# Altium footprint library Library.PcbLib: 308 footprints (part 4 of 21)
Each footprint in its own frame and in the unit in brackets; x right, y up, seen from the top. Pads: shape width x height; smd on the part's side, far side on the other; paste and mask are expansions set on the pad; w line width, h text height; cw(c..) or ccw(c..) is an arc to the next point about the centre after c.
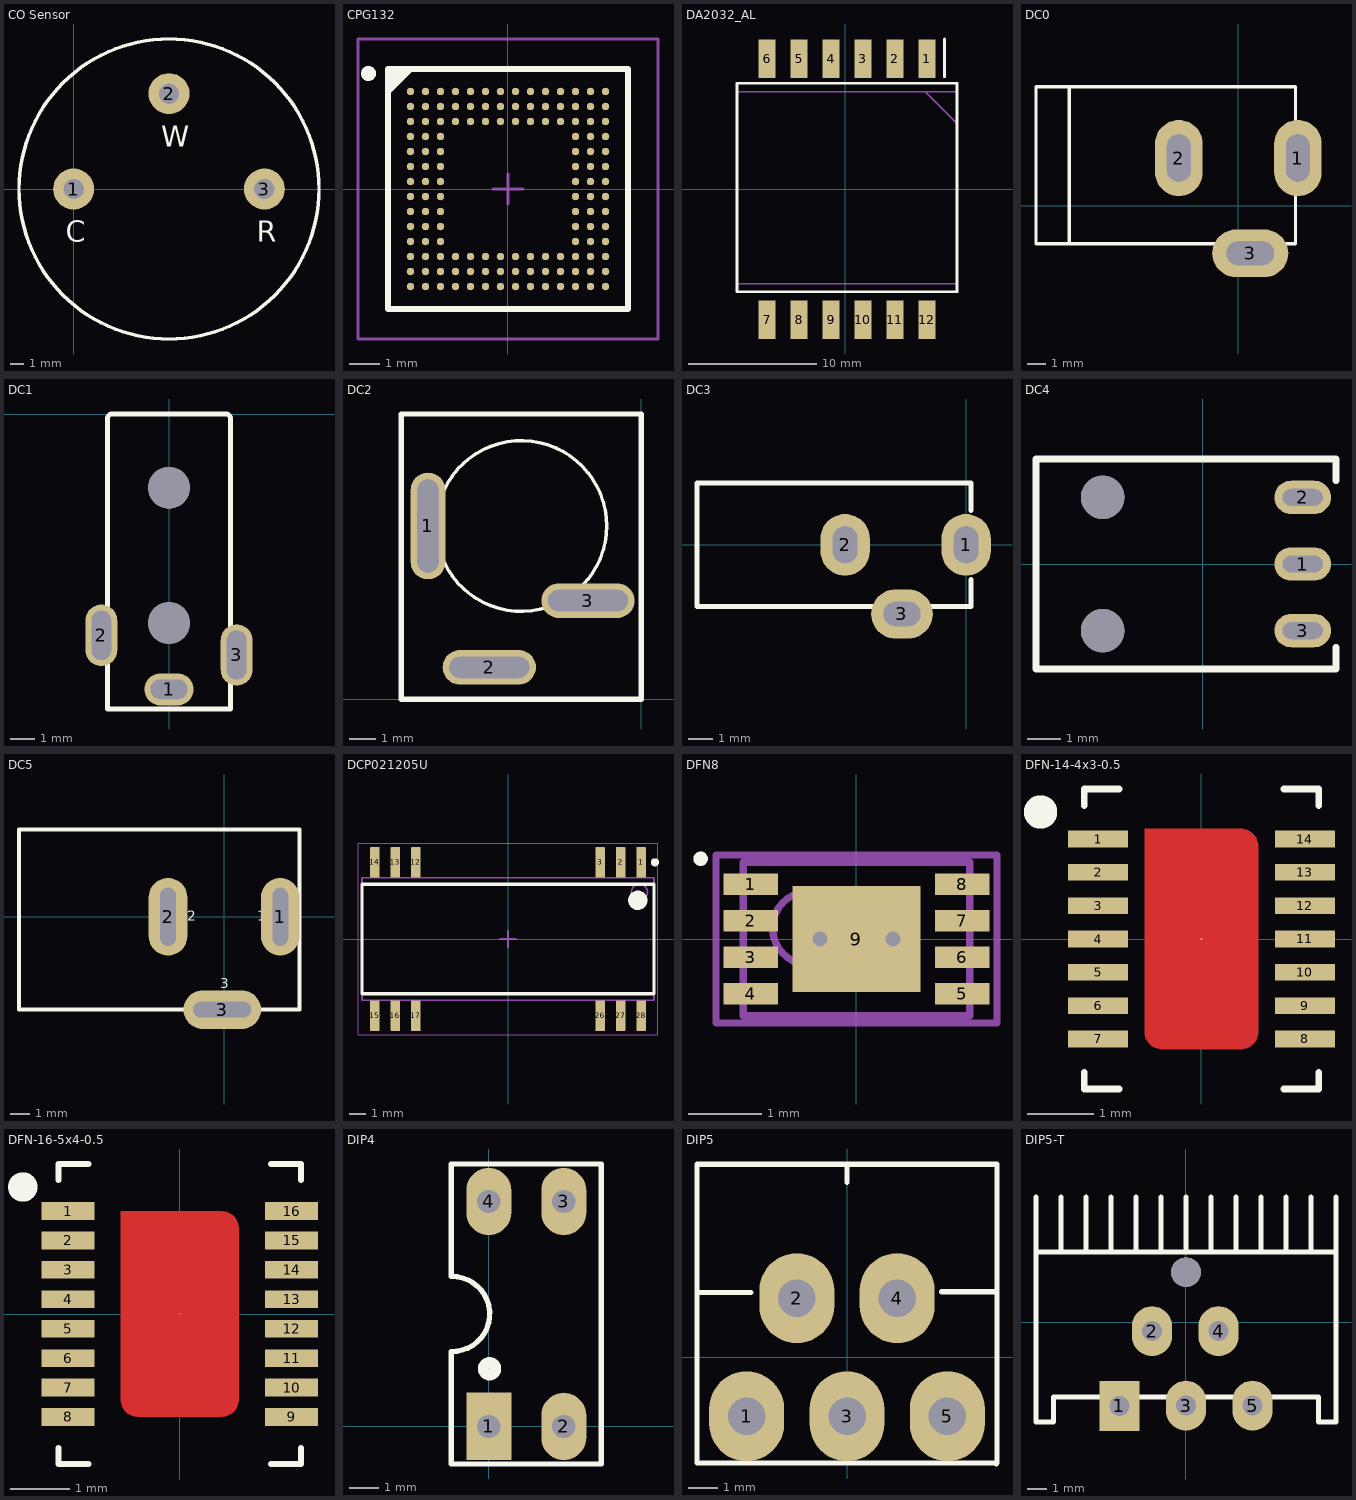
[diagram p3: the footprints below, top view; thin cyan lines are the x and y axes]

## CO Sensor [mm]
pads (3):
  round 3 hole 1.5: 1(0,0) 2(7,7) 3(14,0)
Top Overlay:
  circle w0.254: c7,0 r11
  text "C" at -0.559,-3.886 h1.52
  text "W" at 6.441,3.114 h1.52
  text "R" at 13.441,-3.886 h1.52

## CPG132 [mm] "BGA, 132-Leads, Body 8x8mm, Pitch 0.5mm"
height 1.1
pads (132):
  round 0.25 smd: A1(-3.25,3.25) A2(-2.75,3.25) A3(-2.25,3.25) A4(-1.75,3.25) A5(-1.25,3.25) A6(-0.75,3.25) A7(-0.25,3.25) A8(0.25,3.25) A9(0.75,3.25) A10(1.25,3.25) A11(1.75,3.25) A12(2.25,3.25) A13(2.75,3.25) A14(3.25,3.25) B1(-3.25,2.75) B2(-2.75,2.75) B3(-2.25,2.75) B4(-1.75,2.75) B5(-1.25,2.75) B6(-0.75,2.75) B7(-0.25,2.75) B8(0.25,2.75) B9(0.75,2.75) B10(1.25,2.75) B11(1.75,2.75) B12(2.25,2.75) B13(2.75,2.75) B14(3.25,2.75) C1(-3.25,2.25) C2(-2.75,2.25) C3(-2.25,2.25) C4(-1.75,2.25) C5(-1.25,2.25) C6(-0.75,2.25) C7(-0.25,2.25) C8(0.25,2.25) C9(0.75,2.25) C10(1.25,2.25) C11(1.75,2.25) C12(2.25,2.25) C13(2.75,2.25) C14(3.25,2.25) D1(-3.25,1.75) D2(-2.75,1.75) D3(-2.25,1.75) D12(2.25,1.75) D13(2.75,1.75) D14(3.25,1.75) E1(-3.25,1.25) E2(-2.75,1.25) E3(-2.25,1.25) E12(2.25,1.25) E13(2.75,1.25) E14(3.25,1.25) F1(-3.25,0.75) F2(-2.75,0.75) F3(-2.25,0.75) F12(2.25,0.75) F13(2.75,0.75) F14(3.25,0.75) G1(-3.25,0.25) G2(-2.75,0.25) G3(-2.25,0.25) G12(2.25,0.25) G13(2.75,0.25) G14(3.25,0.25) H1(-3.25,-0.25) H2(-2.75,-0.25) H3(-2.25,-0.25) H12(2.25,-0.25) H13(2.75,-0.25) H14(3.25,-0.25) J1(-3.25,-0.75) J2(-2.75,-0.75) J3(-2.25,-0.75) J12(2.25,-0.75) J13(2.75,-0.75) J14(3.25,-0.75) K1(-3.25,-1.25) K2(-2.75,-1.25) K3(-2.25,-1.25) K12(2.25,-1.25) K13(2.75,-1.25) K14(3.25,-1.25) L1(-3.25,-1.75) L2(-2.75,-1.75) L3(-2.25,-1.75) L12(2.25,-1.75) L13(2.75,-1.75) L14(3.25,-1.75) M1(-3.25,-2.25) M2(-2.75,-2.25) M3(-2.25,-2.25) M4(-1.75,-2.25) M5(-1.25,-2.25) M6(-0.75,-2.25) M7(-0.25,-2.25) M8(0.25,-2.25) M9(0.75,-2.25) M10(1.25,-2.25) M11(1.75,-2.25) M12(2.25,-2.25) M13(2.75,-2.25) M14(3.25,-2.25) N1(-3.25,-2.75) N2(-2.75,-2.75) N3(-2.25,-2.75) N4(-1.75,-2.75) N5(-1.25,-2.75) N6(-0.75,-2.75) N7(-0.25,-2.75) N8(0.25,-2.75) N9(0.75,-2.75) N10(1.25,-2.75) N11(1.75,-2.75) N12(2.25,-2.75) N13(2.75,-2.75) N14(3.25,-2.75) P1(-3.25,-3.25) P2(-2.75,-3.25) P3(-2.25,-3.25) P4(-1.75,-3.25) P5(-1.25,-3.25) P6(-0.75,-3.25) P7(-0.25,-3.25) P8(0.25,-3.25) P9(0.75,-3.25) P10(1.25,-3.25) P11(1.75,-3.25) P12(2.25,-3.25) P13(2.75,-3.25) P14(3.25,-3.25)
Top Overlay:
  circle w0.25: c-4.65,3.85 r0.125
  region: -3.242,4 -4,3.242 -4,4
  lines w0.2: -4,3.242 -3.242,4 ; -4,-4 -4,4 4,4 4,-4 -4,-4
Mechanical 13:
  lines w0.1: -4,-4 -4,4 4,4 4,-4 -4,-4
Mechanical 15:
  lines w0.1: -0.5,0 0.5,0 ; 0,-0.5 0,0.5 ; -5,-5 -5,5 5,5 5,-5 -5,-5
3D body: height 0.23, standoff -0.03, extent 1.119,3.126 1.372,3.378
3D body: height 0.23, standoff -0.03, extent 1.119,2.618 1.372,2.87
3D body: height 0.23, standoff -0.03, extent 1.119,2.135 1.372,2.388
3D body: height 0.23, standoff -0.03, extent 1.627,2.135 1.88,2.388
3D body: height 0.23, standoff -0.03, extent 1.627,2.618 1.88,2.87
3D body: height 0.23, standoff -0.03, extent 1.627,3.126 1.88,3.378
3D body: height 0.23, standoff -0.03, extent 0.636,2.135 0.889,2.388
3D body: height 0.23, standoff -0.03, extent 0.636,2.618 0.889,2.87
3D body: height 0.23, standoff -0.03, extent 0.636,3.126 0.889,3.378
3D body: height 0.23, standoff -0.03, extent 0.128,2.135 0.381,2.388
3D body: height 0.23, standoff -0.03, extent 0.128,2.618 0.381,2.87
3D body: height 0.23, standoff -0.03, extent 0.128,3.126 0.381,3.378
3D body: height 0.23, standoff -0.03, extent -0.38,2.135 -0.127,2.388
3D body: height 0.23, standoff -0.03, extent -0.38,2.618 -0.127,2.87
3D body: height 0.23, standoff -0.03, extent -0.38,3.126 -0.127,3.378
3D body: height 0.23, standoff -0.03, extent -0.888,2.135 -0.635,2.388
3D body: height 0.23, standoff -0.03, extent -0.888,2.618 -0.635,2.87
3D body: height 0.23, standoff -0.03, extent -0.888,3.126 -0.635,3.378
3D body: height 0.23, standoff -0.03, extent -1.371,2.135 -1.118,2.388
3D body: height 0.23, standoff -0.03, extent -1.371,2.618 -1.118,2.87
3D body: height 0.23, standoff -0.03, extent -1.371,3.126 -1.118,3.378
3D body: height 0.23, standoff -0.03, extent -1.879,2.135 -1.626,2.388
3D body: height 0.23, standoff -0.03, extent -1.879,2.618 -1.626,2.87
3D body: height 0.23, standoff -0.03, extent -1.879,3.126 -1.626,3.378
3D body: height 0.23, standoff -0.03, extent -2.387,2.135 -2.134,2.388
3D body: height 0.23, standoff -0.03, extent -2.387,2.618 -2.134,2.87
3D body: height 0.23, standoff -0.03, extent -2.387,3.126 -2.134,3.378
3D body: height 0.23, standoff -0.03, extent -2.869,2.135 -2.616,2.388
3D body: height 0.23, standoff -0.03, extent -2.869,2.618 -2.616,2.87
3D body: height 0.23, standoff -0.03, extent -2.869,3.126 -2.616,3.378
3D body: height 0.23, standoff -0.03, extent -3.377,2.135 -3.124,2.388
3D body: height 0.23, standoff -0.03, extent -3.377,2.618 -3.124,2.87
3D body: height 0.23, standoff -0.03, extent -3.377,3.126 -3.124,3.378
3D body: height 0.23, standoff -0.03, extent 3.126,-1.372 3.378,-1.119
3D body: height 0.23, standoff -0.03, extent 2.618,-1.372 2.87,-1.119
3D body: height 0.23, standoff -0.03, extent 2.135,-1.372 2.388,-1.119
3D body: height 0.23, standoff -0.03, extent 2.135,-1.88 2.388,-1.627
3D body: height 0.23, standoff -0.03, extent 2.618,-1.88 2.87,-1.627
3D body: height 0.23, standoff -0.03, extent 3.126,-1.88 3.378,-1.627
3D body: height 0.23, standoff -0.03, extent 2.135,-0.889 2.388,-0.636
3D body: height 0.23, standoff -0.03, extent 2.618,-0.889 2.87,-0.636
3D body: height 0.23, standoff -0.03, extent 3.126,-0.889 3.378,-0.636
3D body: height 0.23, standoff -0.03, extent 2.135,-0.381 2.388,-0.128
3D body: height 0.23, standoff -0.03, extent 2.618,-0.381 2.87,-0.128
3D body: height 0.23, standoff -0.03, extent 3.126,-0.381 3.378,-0.128
3D body: height 0.23, standoff -0.03, extent 2.135,0.127 2.388,0.38
3D body: height 0.23, standoff -0.03, extent 2.618,0.127 2.87,0.38
3D body: height 0.23, standoff -0.03, extent 3.126,0.127 3.378,0.38
3D body: height 0.23, standoff -0.03, extent 2.135,0.635 2.388,0.888
3D body: height 0.23, standoff -0.03, extent 2.618,0.635 2.87,0.888
3D body: height 0.23, standoff -0.03, extent 3.126,0.635 3.378,0.888
3D body: height 0.23, standoff -0.03, extent 2.135,1.118 2.388,1.371
3D body: height 0.23, standoff -0.03, extent 2.618,1.118 2.87,1.371
3D body: height 0.23, standoff -0.03, extent 3.126,1.118 3.378,1.371
3D body: height 0.23, standoff -0.03, extent 2.135,1.626 2.388,1.879
3D body: height 0.23, standoff -0.03, extent 2.618,1.626 2.87,1.879
3D body: height 0.23, standoff -0.03, extent 3.126,1.626 3.378,1.879
3D body: height 0.23, standoff -0.03, extent 2.135,2.134 2.388,2.387
3D body: height 0.23, standoff -0.03, extent 2.618,2.134 2.87,2.387
3D body: height 0.23, standoff -0.03, extent 3.126,2.134 3.378,2.387
3D body: height 0.23, standoff -0.03, extent 2.135,2.616 2.388,2.869
3D body: height 0.23, standoff -0.03, extent 2.618,2.616 2.87,2.869
3D body: height 0.23, standoff -0.03, extent 3.126,2.616 3.378,2.869
3D body: height 0.23, standoff -0.03, extent 2.135,3.124 2.388,3.377
3D body: height 0.23, standoff -0.03, extent 2.618,3.124 2.87,3.377
3D body: height 0.23, standoff -0.03, extent 3.126,3.124 3.378,3.377
3D body: height 0.23, standoff -0.03, extent -1.372,-3.378 -1.119,-3.126
3D body: height 0.23, standoff -0.03, extent -1.372,-2.87 -1.119,-2.618
3D body: height 0.23, standoff -0.03, extent -1.372,-2.388 -1.119,-2.135
3D body: height 0.23, standoff -0.03, extent -1.88,-2.388 -1.627,-2.135
3D body: height 0.23, standoff -0.03, extent -1.88,-2.87 -1.627,-2.618
3D body: height 0.23, standoff -0.03, extent -1.88,-3.378 -1.627,-3.126
3D body: height 0.23, standoff -0.03, extent -0.889,-2.388 -0.636,-2.135
3D body: height 0.23, standoff -0.03, extent -0.889,-2.87 -0.636,-2.618
3D body: height 0.23, standoff -0.03, extent -0.889,-3.378 -0.636,-3.126
3D body: height 0.23, standoff -0.03, extent -0.381,-2.388 -0.128,-2.135
3D body: height 0.23, standoff -0.03, extent -0.381,-2.87 -0.128,-2.618
3D body: height 0.23, standoff -0.03, extent -0.381,-3.378 -0.128,-3.126
3D body: height 0.23, standoff -0.03, extent 0.127,-2.388 0.38,-2.135
3D body: height 0.23, standoff -0.03, extent 0.127,-2.87 0.38,-2.618
3D body: height 0.23, standoff -0.03, extent 0.127,-3.378 0.38,-3.126
3D body: height 0.23, standoff -0.03, extent 0.635,-2.388 0.888,-2.135
3D body: height 0.23, standoff -0.03, extent 0.635,-2.87 0.888,-2.618
3D body: height 0.23, standoff -0.03, extent 0.635,-3.378 0.888,-3.126
3D body: height 0.23, standoff -0.03, extent 1.118,-2.388 1.371,-2.135
3D body: height 0.23, standoff -0.03, extent 1.118,-2.87 1.371,-2.618
3D body: height 0.23, standoff -0.03, extent 1.118,-3.378 1.371,-3.126
3D body: height 0.23, standoff -0.03, extent 1.626,-2.388 1.879,-2.135
3D body: height 0.23, standoff -0.03, extent 1.626,-2.87 1.879,-2.618
3D body: height 0.23, standoff -0.03, extent 1.626,-3.378 1.879,-3.126
3D body: height 0.23, standoff -0.03, extent 2.134,-2.388 2.387,-2.135
3D body: height 0.23, standoff -0.03, extent 2.134,-2.87 2.387,-2.618
3D body: height 0.23, standoff -0.03, extent 2.134,-3.378 2.387,-3.126
3D body: height 0.23, standoff -0.03, extent 2.616,-2.388 2.869,-2.135
3D body: height 0.23, standoff -0.03, extent 2.616,-2.87 2.869,-2.618
3D body: height 0.23, standoff -0.03, extent 2.616,-3.378 2.869,-3.126
3D body: height 0.23, standoff -0.03, extent 3.124,-2.388 3.377,-2.135
3D body: height 0.23, standoff -0.03, extent 3.124,-2.87 3.377,-2.618
3D body: height 0.23, standoff -0.03, extent 3.124,-3.378 3.377,-3.126
3D body: height 0.23, standoff -0.03, extent -3.378,-3.377 -3.126,-3.124
3D body: height 0.23, standoff -0.03, extent -2.87,-3.377 -2.618,-3.124
3D body: height 0.23, standoff -0.03, extent -2.388,-3.377 -2.135,-3.124
3D body: height 0.23, standoff -0.03, extent -3.378,-2.869 -3.126,-2.616
3D body: height 0.23, standoff -0.03, extent -2.87,-2.869 -2.618,-2.616
3D body: height 0.23, standoff -0.03, extent -2.388,-2.869 -2.135,-2.616
3D body: height 0.23, standoff -0.03, extent -3.378,-2.387 -3.126,-2.134
3D body: height 0.23, standoff -0.03, extent -2.87,-2.387 -2.618,-2.134
3D body: height 0.23, standoff -0.03, extent -2.388,-2.387 -2.135,-2.134
3D body: height 0.23, standoff -0.03, extent -3.378,-1.879 -3.126,-1.626
3D body: height 0.23, standoff -0.03, extent -2.87,-1.879 -2.618,-1.626
3D body: height 0.23, standoff -0.03, extent -2.388,-1.879 -2.135,-1.626
3D body: height 0.23, standoff -0.03, extent -3.378,-1.371 -3.126,-1.118
3D body: height 0.23, standoff -0.03, extent -2.87,-1.371 -2.618,-1.118
3D body: height 0.23, standoff -0.03, extent -2.388,-1.371 -2.135,-1.118
3D body: height 0.23, standoff -0.03, extent -3.378,-0.888 -3.126,-0.635
3D body: height 0.23, standoff -0.03, extent -2.87,-0.888 -2.618,-0.635
3D body: height 0.23, standoff -0.03, extent -2.388,-0.888 -2.135,-0.635
3D body: height 0.23, standoff -0.03, extent -3.378,-0.38 -3.126,-0.127
3D body: height 0.23, standoff -0.03, extent -2.87,-0.38 -2.618,-0.127
3D body: height 0.23, standoff -0.03, extent -2.388,-0.38 -2.135,-0.127
3D body: height 0.23, standoff -0.03, extent -3.378,0.128 -3.126,0.381
3D body: height 0.23, standoff -0.03, extent -2.87,0.128 -2.618,0.381
3D body: height 0.23, standoff -0.03, extent -2.388,0.128 -2.135,0.381
3D body: height 0.23, standoff -0.03, extent -3.378,0.636 -3.126,0.889
3D body: height 0.23, standoff -0.03, extent -2.87,0.636 -2.618,0.889
3D body: height 0.23, standoff -0.03, extent -2.388,0.636 -2.135,0.889
3D body: height 0.23, standoff -0.03, extent -3.378,1.627 -3.126,1.88
3D body: height 0.23, standoff -0.03, extent -2.87,1.627 -2.618,1.88
3D body: height 0.23, standoff -0.03, extent -2.388,1.627 -2.135,1.88
3D body: height 0.23, standoff -0.03, extent -2.388,1.119 -2.135,1.372
3D body: height 0.23, standoff -0.03, extent -2.87,1.119 -2.618,1.372
3D body: height 0.23, standoff -0.03, extent -3.378,1.119 -3.126,1.372
3D body: height 1.07, standoff 0.25, extent -3.556,-3.556 3.556,3.556
3D body: height 0.48, standoff 0.46, extent -4,3.111 -3.111,4
3D body: height 0.46, standoff 0.2, extent -4,-4 4,4

## DA2032_AL [mm]
pads (12):
  rect 1.3x3 smd: 1(6.377,10.2) 2(3.877,10.2) 3(1.377,10.2) 4(-1.123,10.2) 5(-3.623,10.2) 6(-6.123,10.2) 7(-6.123,-10.2) 8(-3.623,-10.2) 9(-1.123,-10.2) 10(1.377,-10.2) 11(3.877,-10.2) 12(6.377,-10.2)
Top Overlay:
  lines w0.2: 7.75,8.8 7.75,11.75 ; -8.473,-8.023 8.727,-8.023 8.727,8.277 -8.473,8.277 -8.473,-8.023
Top Courtyard:
  lines w0.1: 6.227,7.617 8.727,5.117 ; -8.473,-7.363 8.727,-7.363 8.727,7.617 -8.473,7.617 -8.473,-7.363
3D body "DA2032_AL.STEP": height 8.94, standoff 0, extent -8.473,-11 8.727,11

## DC0 [mil] "Jac DC input"
height 200
pads (3):
  oval 100x160 hole 50 slot 100 at 90 deg: 1(125,100) 2(-125,100)
  oval 160x100 hole 50 slot 100 at 0 deg: 3(25,-100)
Top Overlay:
  lines w7: -355,-80 -355,250 ; -425,-80 -425,250 120,250 120,-80 -425,-80
3D body "SW3dPS-dc range - dc connector[4840.2201].STEP": height 433.67, standoff -137.2, extent -410.35,-105.12 134,269.12

## DC1 [mm] "WR-DC_DC Power Jack_Right Angled_THT Center Pin ?0.65_Plug ID ?0.75_Plug OD ?2.35_with Peg"
height 5
pads (5):
  oval 2x1.3 hole 0.8 slot 1.5 at 0 deg: 1(0,-11.2)
  oval 1.3x2.5 hole 0.8 slot 2 at 90 deg: 2(-2.75,-9) 3(2.75,-9.8)
  round 1.7 hole 1.7 unplated: ""(0,-8.5) ""(0,-3)
Top Overlay:
  lines w0.2: -2.5,-12 2.5,-12 2.5,-0.2 ccw(c2.312,-0.188) 2.3,0 -2.3,0 ccw(c-2.312,-0.188) -2.5,-0.2 -2.5,-12
3D body "694101308002.stp": height 5, standoff -2.3, extent -2.9,-12 2.9,0

## DC2 [mm] "WR-DC_DC Power Jack_Vertical_THT WR-DC_DC Power Jack_Vertical_THT"
height 14
pads (3):
  oval 1.3x4 hole 0.8 slot 3.5 at 90 deg: 1(-8,6.5)
  oval 3.5x1.3 hole 0.8 slot 3 at 0 deg: 2(-5.7,1.2) 3(-2,3.7)
Top Overlay:
  circle w0.127: c-4.5,6.5 r3.2
  lines w0.2: -9,0 0,0 0,10.7 -9,10.7 -9,0
3D body "694106402002.stp": height 14, standoff -3.6, extent -9,0 0,10.7

## DC3 [mm] "WR-DC_DC Power Jack_Right Angled_THT Center Pin ?1.0_Plug ID ?1.05_Plug OD ?3.5"
height 7.4
pads (3):
  oval 2x2.5 hole 1 slot 1.5 at 90 deg: 1(0,0) 2(-4.9,0)
  oval 2.5x2 hole 1 slot 1.5 at 0 deg: 3(-2.6,-2.8)
Top Overlay:
  lines w0.2: -3.8,-2.5 -10.9,-2.5 -10.9,2.5 0.2,2.5 0.2,1.4 ; -1.4,-2.5 0.2,-2.5 0.2,-1.4
3D body "694102303002.stp": height 7.81, standoff -2.59, extent -10.9,-3 0.4,2.5

## DC4 [mm] "WR-DC_DC Power Jack_Right Angled_THT Center Pin ?1.0_Plug ID ?1.05_Plug OD ?3.5_with Peg"
height 5
pads (5):
  oval 1.7x1 hole 0.5 slot 1.2 at 0 deg: 1(3,0) 2(3,2) 3(3,-2)
  round 1.3 hole 1.3 unplated: ""(-3,-2) ""(-3,2)
Top Overlay:
  lines w0.2: 4,-2.5 4,-3.15 -5,-3.15 -5,3.15 4,3.15 4,2.5
3D body "694102304002.stp": height 5, standoff -3.05, extent -5,-3.149 4,3.151

## DC5 [mm] "WR-DC_DC Power Jack_Right Angled_THT Center Pin ?2.0_Plug ID ?2.05_Plug OD ?5.5"
height 10.7
pads (3):
  oval 2x4 hole 0.8 slot 3 at 90 deg: 1(2.9,0) 2(-2.9,0)
  oval 4x2 hole 0.8 slot 3 at 0 deg: 3(-0.1,-4.8)
Top Overlay:
  lines w0.2: -2.1,-4.8 -10.6,-4.8 -10.6,4.5 3.9,4.5 3.9,-4.8 1.9,-4.8
  text "3" at -0.2,-3.7 h0.5
  text "2" at -1.9,-0.2 h0.5
  text "1" at 1.7,-0.2 h0.5
3D body "694106301002.stp": height 10.7, standoff -3.8, extent -10.6,-4.9 3.9,4.5

## DCP021205U [mm]
pads (12):
  rrect17% 0.6x1.9 smd: 1(8.255,4.75) 2(6.985,4.75) 3(5.715,4.75) 12(-5.715,4.75) 13(-6.985,4.75) 14(-8.255,4.75) 15(-8.255,-4.75) 16(-6.985,-4.75) 17(-5.715,-4.75) 26(5.715,-4.75) 27(6.985,-4.75) 28(8.255,-4.75)
Top Overlay:
  circle w0.25: c9.105,4.75 r0.125
  circle w0.6: c8.05,2.4 r0.3
  lines w0.2: -9.05,-3.4 9.05,-3.4 9.05,3.4 -9.05,3.4 -9.05,-3.4
Top Courtyard:
  lines w0.05: -9.3,-5.925 9.3,-5.925 9.3,5.925 -9.3,5.925 -9.3,-5.925
  lines w0.1: -0.5,0 0.5,0 ; 0,-0.5 0,0.5
Mechanical 13:
  circle w0.1: c8.15,2.9 r0.5
  lines w0.1: -9.05,-3.8 9.05,-3.8 9.05,3.8 -9.05,3.8 -9.05,-3.8
3D body "DVB0012A.stp": height 2.5, standoff 0, extent -8.95,-5.184 8.95,5.184

## DFN8 [mm] "SON, 8-Leads, Body 2x3mm, Pitch 0.5mm, Microchip Recommended"
height 1
pads (9):
  rect 0.75x0.3 smd: 1(-1.45,0.75) 2(-1.45,0.25) 3(-1.45,-0.25) 4(-1.45,-0.75) 5(1.45,-0.75) 6(1.45,-0.25) 7(1.45,0.25) 8(1.45,0.75)
  rect 1.75x1.45 smd: 9(0,0)
via -0.5,0 diameter 0.5 hole 0.2
via 0.5,0 diameter 0.5 hole 0.2
Top Overlay:
  circle w0.1: c-2.135,1.1 r0.05
Mechanical 13:
  circle w0.1: c-0.65,0.15 r0.5
  lines w0.1: -1.55,-1.05 1.55,-1.05 1.55,1.05 -1.55,1.05 -1.55,-1.05
Mechanical 15:
  lines w0.1: -0.5,0 0.5,0 ; 0,-0.5 0,0.5 ; -1.925,-1.15 1.925,-1.15 1.925,1.15 -1.925,1.15 -1.925,-1.15
3D body "User Library-DFN-8-1.step": height 0.8, standoff 0, extent -1.55,-1 1.55,1

## DFN-14-4x3-0.5 [mm]
pads (15):
  rect 0.9x0.25 smd mask+0.05: 1(-1.55,1.5) 2(-1.55,1) 3(-1.55,0.5) 4(-1.55,0) 5(-1.55,-0.5) 6(-1.55,-1) 7(-1.55,-1.5) 8(1.55,-1.5) 9(1.55,-1) 10(1.55,-0.5) 11(1.55,0) 12(1.55,0.5) 13(1.55,1) 14(1.55,1.5)
  round 0.025 smd mask+0.05: 15(0,0)
Top Layer:
  region: 0.85,-1.395 0.85,-1.42 0.84,-1.469 0.821,-1.516 0.793,-1.558 0.758,-1.593 0.716,-1.621 0.669,-1.64 0.62,-1.65 0.595,-1.65 -0.595,-1.65 -0.62,-1.65 -0.669,-1.64 -0.716,-1.621 -0.758,-1.593 -0.793,-1.558 -0.821,-1.516 -0.84,-1.469 -0.85,-1.42 -0.85,-1.395 -0.85,1.65 0.595,1.65 0.62,1.65 0.669,1.64 0.716,1.621 0.758,1.593 0.793,1.558 0.821,1.516 0.84,1.469 0.85,1.42 0.85,1.395
Top Overlay:
  circle w0.4: c-2.413,1.905 r0.05
  lines w0.1: -1.76,-2 -1.76,-2.25 -1.234,-2.25 ; -1.76,2 -1.76,2.25 -1.234,2.25 ; 1.234,-2.25 1.76,-2.25 1.76,-2 ; 1.234,2.25 1.76,2.25 1.76,2
3D body "User Library-My-DFN-14-4x3-0_5.STEP": height 0.8, standoff 0, extent -1.56,-2.05 1.56,2.05

## DFN-16-5x4-0.5 [mm]
pads (17):
  rect 0.9x0.3 smd mask+0.05: 1(-1.9,1.75) 2(-1.9,1.25) 3(-1.9,0.75) 4(-1.9,0.25) 5(-1.9,-0.25) 6(-1.9,-0.75) 7(-1.9,-1.25) 8(-1.9,-1.75) 9(1.9,-1.75) 10(1.9,-1.25) 11(1.9,-0.75) 12(1.9,-0.25) 13(1.9,0.25) 14(1.9,0.75) 15(1.9,1.25) 16(1.9,1.75)
  round 0.025 smd mask+0.05: 17(0,0)
Top Layer:
  region: 1,-1.45 1,-1.48 0.988,-1.538 0.966,-1.592 0.933,-1.641 0.891,-1.683 0.842,-1.716 0.788,-1.738 0.73,-1.75 0.7,-1.75 -0.7,-1.75 -0.73,-1.75 -0.788,-1.738 -0.842,-1.716 -0.891,-1.683 -0.933,-1.641 -0.966,-1.592 -0.988,-1.538 -1,-1.48 -1,-1.45 -1,1.75 0.7,1.75 0.73,1.75 0.788,1.738 0.842,1.716 0.891,1.683 0.933,1.641 0.966,1.592 0.988,1.538 1,1.48 1,1.45
Top Overlay:
  circle w0.4: c-2.667,2.159 r0.05
  lines w0.1: -2.06,-2.278 -2.06,-2.55 -1.552,-2.55 ; -2.06,2.278 -2.06,2.55 -1.552,2.55 ; 1.552,-2.55 2.06,-2.55 2.06,-2.278 ; 1.552,2.55 2.06,2.55 2.06,2.278
3D body "User Library-My-DFN-16-5x4-0_5.STEP": height 0.8, standoff 0, extent -2.06,-2.55 2.06,2.55

## DIP4 [mil]
height 100
pads (4):
  rect 60x90 hole 31: 1(0,0)
  oval 60x90 hole 31: 2(100,0) 3(100,300) 4(0,300)
Top Overlay:
  circle w15: c1,77 r8
  lines w7: -50.38,100.05 ccw(c-48.69,150.02) -50,200 ; -50,100 -50,-50 150,-50 150,350 -50,350 -50,201
3D body "SW3DPS-DIP4-DEFAULT.STEP": height 169.69, standoff -129.13, extent -59.06,-10 159.06,304.96

## DIP5 [mm]
pads (5):
  oval 2.54x3.048 hole 1.27: 1(-3.4,-2) 2(-1.7,2) 3(0,-2) 4(1.7,2) 5(3.4,-2)
Top Overlay:
  lines w0.178: -5.076,2.191 -3.248,2.191 ; 0,5.918 0,6.502 ; 3.204,2.216 5.033,2.216 ; -5.08,-3.581 5.029,-3.581 5.055,-3.607 5.08,-3.581 5.08,6.534 -5.08,6.534 -5.08,-3.581
3D body "TO220-5.STEP": height 18.81, standoff -9.47, extent -4.993,-2.246 5.207,6.31

## DIP5-T [mil]
pads (6):
  rect 80x100 hole 40: 1(-132,-167.09)
  oval 80x100 hole 40: 2(-67,-18) 3(1,-167) 4(66,-18) 5(134,-167)
  round 59.06 hole 59.06: ""(1,100)
Top Overlay:
  lines w10: -299,140 301,140 ; -299,250 -299,-200 -264,-200 -264,-150 266,-150 266,-200 301,-200 301,250 ; -249,140 -249,250 ; -199,140 -199,250 ; -149,140 -149,250 ; -99,140 -99,250 ; -49,140 -49,250 ; 1,140 1,250 ; 51,140 51,250 ; 101,140 101,250 ; 151,140 151,250 ; 201,140 201,250 ; 251,140 251,250
3D body "SW3dPS-TO220-5.STEP": height 859.05, standoff -85.43, extent -199,-174.91 201,149.5